# Altium footprint library Tomra_Cadstar_Footprints.PcbLib: 373 footprints (part 2 of 24)
Each footprint in its own frame and in the unit in brackets; x right, y up, seen from the top. Pads: shape width x height; smd on the part's side, far side on the other; paste and mask are expansions set on the pad; w line width, h text height; cw(c..) or ccw(c..) is an arc to the next point about the centre after c.
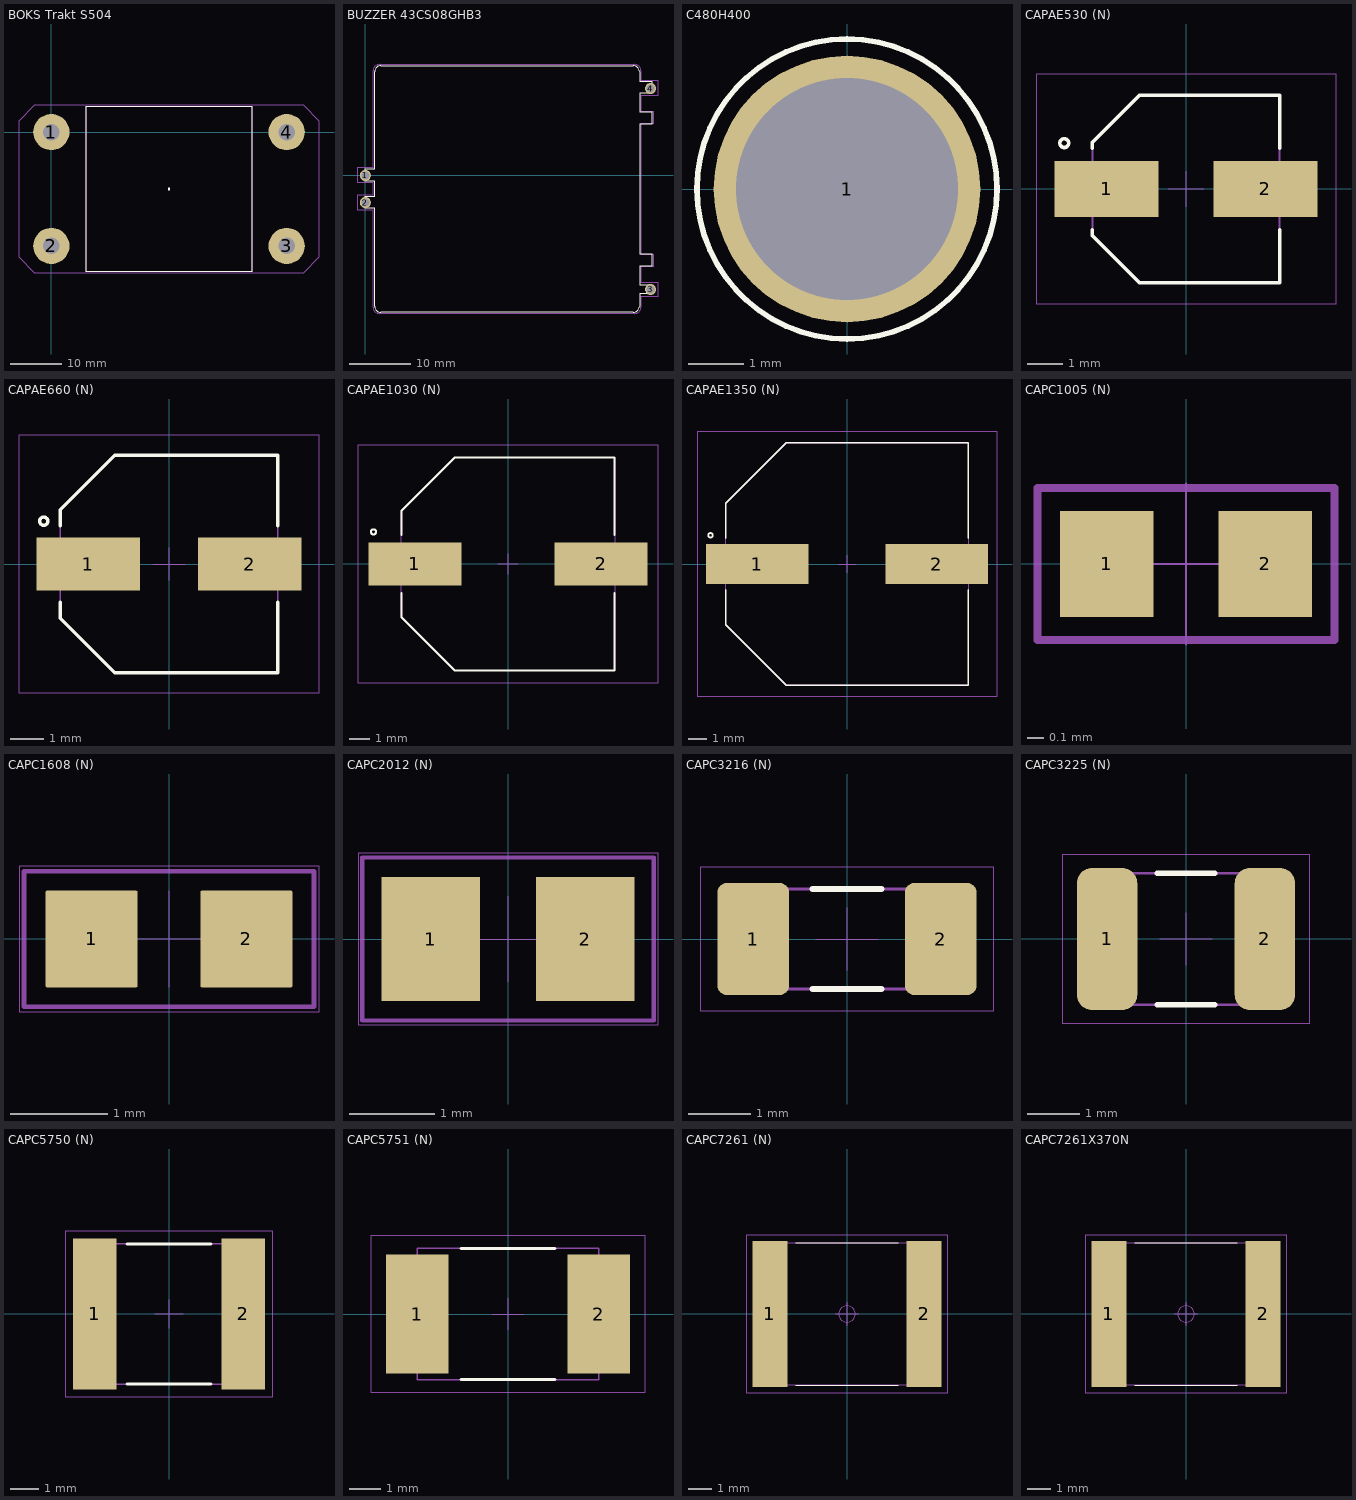
[diagram p1: the footprints below, top view; thin cyan lines are the x and y axes]

## BOKS Trakt S504 [mm]
pads (4):
  round 7 / inner round 1.524 / far side round 7 hole 3.2 paste+0 mask+0: 1(0,0) 2(0,-22) 3(45.45,-22) 4(45.45,0)
Top Silk:
  lines w0.1: 6.725,-27 38.725,-27 38.725,5 6.725,5 6.725,-27 ; 22.725,-11.175 cw(c22.725,-11) 22.725,-10.825 cw(c22.725,-11) 22.725,-11.175
  text ".Designator" at -2.48,5.535 h0.7
Top Assembly:
  lines w0.05: 6.725,-27 38.725,-27 38.725,5 6.725,5 6.725,-27
Top Placement:
  lines w0.01: -6.25,-24.203 -3.224,-27.25 48.674,-27.25 51.7,-24.203 51.7,2.203 48.674,5.25 -3.224,5.25 -6.25,2.203 -6.25,-24.203

## BUZZER 43CS08GHB3 [mm]
height 5
pads (4):
  round 1.8 / inner round 1.524 / far side round 1.8 hole 1.3 paste+0 mask+0: 1(0,0) 2(0,-4.4) 3(46.3,-18.5) 4(46.3,14.1)
Top Silk:
  lines w0.1: 0,-5.35 1.5,-5.35 1.5,-21.2 ccw(c2.5,-21.2) 2.5,-22.2 43.5,-22.2 ccw(c43.5,-21.2) 44.5,-21.2 44.5,-19.2 46.5,-19.2 46.5,-17.7 44.5,-17.7 44.5,-14.7 46.5,-14.7 46.5,-12.7 44.5,-12.7 44.5,8.3 46.5,8.3 46.5,10.3 44.5,10.3 44.5,13.3 46.5,13.3 46.5,15.3 44.5,15.3 44.5,16.8 ccw(c43.5,16.8) 43.5,17.8 2.5,17.8 ccw(c2.5,16.8) 1.5,16.8 1.5,1.05 0,1.05 0,-0.95 1.5,-0.95 1.5,-3.35 0,-3.35 0,-5.35
  text ".Designator" at 2.9,18.5 h0.7
Top Placement:
  lines w0.01: -1.185,-5.65 1.266,-5.65 1.266,-21.404 ccw(c2.277,-21.404) 2.277,-22.415 43.718,-22.415 ccw(c43.718,-21.404) 44.728,-21.404 44.728,-19.7 47.5,-19.7 47.5,-17.3 44.728,-17.3 44.728,-14.834 46.75,-14.834 46.75,-12.813 44.728,-12.813 44.728,8.413 46.75,8.413 46.75,10.434 44.728,10.434 44.728,12.9 47.5,12.9 47.5,15.488 44.728,15.488 44.728,17.004 ccw(c43.718,17.004) 43.718,18.015 2.277,18.015 ccw(c2.277,17.004) 1.266,17.004 1.266,1.335 -1.185,1.335 -1.185,-1.205 1.266,-1.205 1.266,-3.11 -1.185,-3.11 -1.185,-5.65

## C480H400 [mm]
height 0.1
pads (1):
  round 4.8 / inner round 1.524 / far side round 4.8 hole 4 paste+0 mask+0: 1(0,0)
Top Silk:
  lines w0.05: 0,-2.7 cw(c0,0) 0,2.7 cw(c0,0) 0,-2.7
  lines w0.1: 0,-2.7 cw(c0,0) 0,2.7 cw(c0,0) 0,-2.7
Top Assembly:
  lines w0.05: 0,-2.7 cw(c0,0) 0,2.7 ; 0,-2.7 ccw(c0,0) 0,2.7 ; 0,-2.7 cw(c0,0) 0,2.7 ; 0,-2.7 ccw(c0,0) 0,2.7
  text ".Designator" at -2.3,2.68 h0.7
Top Placement:
  lines w0.01: 0,-2.7 cw(c0,0) 0,2.7 cw(c0,0) 0,-2.7

## CAPAE530 (N) [mm]
height 6.1
pads (2):
  rect 2.95x1.6 smd paste+0 mask+0: 1(-2.25,0) 2(2.25,0)
Top Silk:
  lines w0.1: -2.65,-1.15 -2.65,-1.325 -1.325,-2.65 2.65,-2.65 2.65,-1.15 ; -2.65,1.15 -2.65,1.325 -1.325,2.65 2.65,2.65 2.65,1.15 ; -3.575,1.3 cw(c-3.45,1.3) -3.325,1.3 cw(c-3.45,1.3) -3.575,1.3
  text ".Designator" at -3.599,-0.35 h0.7
Top Assembly:
  lines w0.05: -2.65,-1.325 -1.325,-2.65 2.65,-2.65 2.65,2.65 -1.325,2.65 -2.65,1.325 -2.65,-1.325
Top Placement:
  lines w0.01: -0.5,0 0.5,0 ; 0,-0.5 0,0.5 ; -4.25,-3.25 4.25,-3.25 4.25,3.25 -4.25,3.25 -4.25,-3.25

## CAPAE660 (N) [mm]
height 7.9
pads (2):
  rect 3.15x1.6 smd paste+0 mask+0: 1(-2.45,0) 2(2.45,0)
Top Silk:
  lines w0.1: -3.3,-1.15 -3.3,-1.65 -1.65,-3.3 3.3,-3.3 3.3,-1.15 ; -3.3,1.15 -3.3,1.65 -1.65,3.3 3.3,3.3 3.3,1.15 ; -3.925,1.3 cw(c-3.8,1.3) -3.675,1.3 cw(c-3.8,1.3) -3.925,1.3
  text ".Designator" at -3.599,-0.35 h0.7
Top Assembly:
  lines w0.05: -3.3,-1.65 -1.65,-3.3 3.3,-3.3 3.3,3.3 -1.65,3.3 -3.3,1.65 -3.3,-1.65
Top Placement:
  lines w0.01: -0.5,0 0.5,0 ; 0,-0.5 0,0.5 ; -4.55,-3.9 4.55,-3.9 4.55,3.9 -4.55,3.9 -4.55,-3.9

## CAPAE1030 (N) [mm]
height 17.5
pads (2):
  rect 4.5x2.1 smd paste+0 mask+0: 1(-4.5,0) 2(4.5,0)
Top Silk:
  lines w0.1: -5.15,-1.4 -5.15,-2.575 -2.575,-5.15 5.15,-5.15 5.15,-1.4 ; -5.15,1.4 -5.15,2.575 -2.575,5.15 5.15,5.15 5.15,1.4 ; -6.625,1.55 cw(c-6.5,1.55) -6.375,1.55 cw(c-6.5,1.55) -6.625,1.55
  text ".Designator" at -3.599,-0.35 h0.7
Top Assembly:
  lines w0.05: -5.15,-2.575 -2.575,-5.15 5.15,-5.15 5.15,5.15 -2.575,5.15 -5.15,2.575 -5.15,-2.575
Top Placement:
  lines w0.01: -0.5,0 0.5,0 ; 0,-0.5 0,0.5 ; -7.25,-5.75 7.25,-5.75 7.25,5.75 -7.25,5.75 -7.25,-5.75

## CAPAE1350 (N) [mm]
height 16.5
pads (2):
  rect 5.7x2.2 smd paste+0 mask+0: 1(-5,0) 2(5,0)
Top Silk:
  lines w0.1: -6.75,-1.45 -6.75,-3.375 -3.375,-6.75 6.75,-6.75 6.75,-1.45 ; -6.75,1.45 -6.75,3.375 -3.375,6.75 6.75,6.75 6.75,1.45 ; -7.725,1.6 cw(c-7.6,1.6) -7.475,1.6 cw(c-7.6,1.6) -7.725,1.6
  text ".Designator" at -3.599,-0.35 h0.7
Top Assembly:
  lines w0.05: -6.75,-3.375 -3.375,-6.75 6.75,-6.75 6.75,6.75 -3.375,6.75 -6.75,3.375 -6.75,-3.375
Top Placement:
  lines w0.01: -0.5,0 0.5,0 ; 0,-0.5 0,0.5 ; -8.35,-7.35 8.35,-7.35 8.35,7.35 -8.35,7.35 -8.35,-7.35

## CAPC1005 (N) [mm]
height 0.6
pads (2):
  rect 0.58x0.66 smd paste+0 mask+0: 1(-0.49,0) 2(0.49,0)
Top Silk:
  text ".Designator" at -3.599,-0.35 h0.7
Top Assembly:
  lines w0.05: -0.92,-0.47 0.92,-0.47 0.92,0.47 -0.92,0.47 -0.92,-0.47
Top Placement:
  lines w0.01: -0.5,0 0.5,0 ; 0,-0.5 0,0.5 ; -0.93,-0.48 0.93,-0.48 0.93,0.48 -0.93,0.48 -0.93,-0.48

## CAPC1608 (N) [mm]
height 0.95
pads (2):
  rrect3% 0.95x1 smd paste+0 mask+0: 1(-0.8,0) 2(0.8,0)
Top Silk:
  text ".Designator" at -3.599,-0.35 h0.7
Top Assembly:
  lines w0.05: -1.5,-0.7 1.5,-0.7 1.5,0.7 -1.5,0.7 -1.5,-0.7
Top Placement:
  lines w0.01: -0.5,0 0.5,0 ; 0,-0.5 0,0.5 ; -1.55,-0.75 1.55,-0.75 1.55,0.75 -1.55,0.75 -1.55,-0.75

## CAPC2012 (N) [mm]
height 0.95
pads (2):
  rect 1.15x1.45 smd paste+0 mask+0: 1(-0.9,0) 2(0.9,0)
Top Silk:
  text ".Designator" at -3.599,-0.35 h0.7
Top Assembly:
  lines w0.05: -1.7,-0.95 1.7,-0.95 1.7,0.95 -1.7,0.95 -1.7,-0.95
Top Placement:
  lines w0.01: -0.5,0 0.5,0 ; 0,-0.5 0,0.5 ; -1.75,-1 1.75,-1 1.75,1 -1.75,1 -1.75,-1

## CAPC3216 (N) [mm]
height 0.95
pads (2):
  rrect28% 1.15x1.8 smd paste+0 mask+0: 1(-1.5,0) 2(1.5,0)
Top Silk:
  lines w0.1: -0.55,-0.8 0.55,-0.8 ; -0.55,0.8 0.55,0.8
  text ".Designator" at -3.599,-0.35 h0.7
Top Assembly:
  lines w0.05: -1.6,-0.8 1.6,-0.8 1.6,0.8 -1.6,0.8 -1.6,-0.8
Top Placement:
  lines w0.01: -0.5,0 0.5,0 ; 0,-0.5 0,0.5 ; -2.35,-1.15 2.35,-1.15 2.35,1.15 -2.35,1.15 -2.35,-1.15

## CAPC3225 (N) [mm]
height 2.8
pads (2):
  rrect50% 1.15x2.7 smd paste+0 mask+0: 1(-1.5,0) 2(1.5,0)
Top Silk:
  lines w0.1: -0.55,-1.25 0.55,-1.25 ; -0.55,1.25 0.55,1.25
  text ".Designator" at -3.599,-0.35 h0.7
Top Assembly:
  lines w0.05: -1.6,-1.25 1.6,-1.25 1.6,1.25 -1.6,1.25 -1.6,-1.25
Top Placement:
  lines w0.01: -0.5,0 0.5,0 ; 0,-0.5 0,0.5 ; -2.35,-1.6 2.35,-1.6 2.35,1.6 -2.35,1.6 -2.35,-1.6

## CAPC5750 (N) [mm]
height 2.79
pads (2):
  rect 1.55x5.4 smd paste+0 mask+0: 1(-2.65,0) 2(2.65,0)
Top Silk:
  lines w0.1: -1.5,-2.5 1.5,-2.5 ; -1.5,2.5 1.5,2.5
  text ".Designator" at -3.599,-0.35 h0.7
Top Assembly:
  lines w0.05: -2.85,-2.5 2.85,-2.5 2.85,2.5 -2.85,2.5 -2.85,-2.5
Top Placement:
  lines w0.01: -0.5,0 0.5,0 ; 0,-0.5 0,0.5 ; -3.7,-2.95 3.7,-2.95 3.7,2.95 -3.7,2.95 -3.7,-2.95

## CAPC5751 (N) [mm]
pads (2):
  rect 2x3.8 smd paste+0 mask+0: 1(-2.9,0) 2(2.9,0)
Top Silk:
  lines w0.1: -1.5,-2.1 1.5,-2.1 ; -1.5,2.1 1.5,2.1
  text ".Designator" at 0,0 h0.7
Top Assembly:
  lines w0.05: -2.9,-2.1 2.9,-2.1 2.9,2.1 -2.9,2.1 -2.9,-2.1
Top Placement:
  lines w0.01: -0.5,0 0.5,0 ; 0,-0.5 0,0.5 ; -4.4,-2.5 4.4,-2.5 4.4,2.5 -4.4,2.5 -4.4,-2.5

## CAPC7261 (N) [mm]
pads (2):
  rect 1.5x6.25 smd paste+0 mask+0: 1(-3.3,0) 2(3.3,0)
Top Silk:
  lines w0.05: -2.2,-3.05 2.2,-3.05 ; -2.2,3.05 2.2,3.05
  text ".Designator" at 0,0 h0.7
Top Assembly:
  lines w0.05: -3.6,-3.05 -3.6,3.05 3.6,3.05 3.6,-3.05 -3.6,-3.05
Top Placement:
  lines w0.05: -0.5,0 0.5,0 ; 0,-0.5 0,0.5 ; -4.3,-3.4 -4.3,3.4 4.3,3.4 4.3,-3.4 -4.3,-3.4 ; -0.35,0 cw(c0,0) 0.35,0 cw(c0,0) -0.35,0

## CAPC7261X370N [mm]
pads (2):
  rect 1.5x6.25 smd paste+0 mask+0: 1(-3.3,0) 2(3.3,0)
Top Silk:
  lines w0.05: -2.2,-3.05 2.2,-3.05 ; -2.2,3.05 2.2,3.05
  text ".Designator" at 0,0 h0.7
Top Assembly:
  lines w0.05: -3.6,-3.05 -3.6,3.05 3.6,3.05 3.6,-3.05 -3.6,-3.05
Top Placement:
  lines w0.05: -0.5,0 0.5,0 ; 0,-0.5 0,0.5 ; -4.3,-3.4 -4.3,3.4 4.3,3.4 4.3,-3.4 -4.3,-3.4 ; -0.35,0 cw(c0,0) 0.35,0 cw(c0,0) -0.35,0